# Altium schematic symbol library LATTICEPLDS_Library.SchLib: 291 symbols (part 18 of 32) (continued)
## LFE5G-85F-BG756 (continued)
part G pins: B1 PL17A (io), C1 PL20C (io), C2 PL17B (io), C3 PL11D (io), C4 PL11C (io), C5 PL11A/ ULC_GPLL0T_IN (io), D1 PL20D (io), D2 PL17D (io), D3 PL17C (io), D4 PL14A (io), D5 PL11B/ ULC_GPLL0C_IN (io), E1 PL23B (io), E3 PL20B (io), E4 PL14B (io), F1 PL23C (io), F2 PL23A (io), F3 PL20A (io), F4 PL14C (io), F5 PL14D (io), H1 PL23D (io), H2 PL26A (io), H3 PL26B (io), H5 PL35B (io), H6 PL35A (io), J1 PL29B (io), J3 PL26C (io), J4 PL32C (io), J6 PL35D (io), J7 PL35C/VREF1_7 (io), K1 PL29C (io), K2 PL29A (io), K3 PL26D (io), K4 PL32D (io), K5 PL38C (io), K6 PL38A (io), K7 PL38B (io), L1 PL29D (io), L2 PL32A (io), L3 PL32B (io), L4 PL38D (io), L6 PL41D (io), L7 PL41C/GR_PCLK7_0 (io), M10 VCCIO7 (power), N3 PL41A/GR_PCLK7_1 (io), N4 PL41B (io), N6 PL44A/PCLKT7_1 (io), N7 PL44B/PCLKC7_1 (io), P6 PL44C/PCLKT7_0 (io), P7 PL44D/PCLKC7_0 (io), P10 VCCIO7 (power), R10 VCCIO7 (power), T10 VCCIO7 (power)
part H pins: AB10 VCCIO8 (power), AC10 VCCIO8 (power), AG1 PB4A/ D7/IO7 (io), AG3 PB13A/ SN/CSN (io), AG4 INITN (io), AG5 TDO (io), AH1 PB4B/ D6/IO6 (io), AH3 PB13B/ CS1N (io), AH4 PROGRAMN (io), AJ1 PB6A/ D5/MISO2/IO5 (io), AJ2 PB11A/ D1/MISO/IO1 (io), AJ3 PB15A/ HOLDN/DI/BUSY/CSSPIN/CEN (io), AJ4 DONE (io), AJ5 TDI (io), AK1 PB6B/ D4/MOSI2/IO4 (io), AK2 PB11B/ D0/MOSI/IO0 (io), AK3 PB15B/ DOUT/CSON (io), AK4 CFG_2 (io), AK5 TCK (io), AL1 PB9A/ D3/IO3 (io), AL3 PB18A/ WRITEN (io), AL4 CFG_1 (io), AM2 PB9B/ D2/IO2 (io), AM3 CCLK (io), AM4 CFG_0 (io), AM5 TMS (io)
part I pins: AC13 VCCHTX0_D0CH0 (power), AC14 VCCHRX0_D0CH0 (power), AC15 VCCHRX1_D0CH1 (power), AC16 VCCHTX1_D0CH1 (power), AC17 VCCHTX0_D1CH0 (power), AC18 VCCHRX0_D1CH0 (power), AC19 VCCHRX1_D1CH1 (power), AC20 VCCHTX1_D1CH1 (power), AK9 HDTXP0_D0CH0 (out), AK10 HDTXN0_D0CH0 (out), AK12 HDTXP0_D0CH1 (out), AK13 HDTXN0_D0CH1 (out), AK18 HDTXP0_D1CH0 (out), AK19 HDTXN0_D1CH0 (out), AK21 HDTXP0_D1CH1 (out), AK22 HDTXN0_D1CH1 (out), AM8 HDRXP0_D0CH0 (in), AM9 HDRXN0_D0CH0 (in), AM11 HDRXP0_D0CH1 (in), AM12 HDRXN0_D0CH1 (in), AM14 REFCLKP_D0 (in), AM15 REFCLKN_D0 (in), AM17 HDRXP0_D1CH0 (in), AM18 HDRXN0_D1CH0 (in), AM20 HDRXP0_D1CH1 (in), AM21 HDRXN0_D1CH1 (in), AM23 REFCLKP_D1 (in), AM24 REFCLKN_D1 (in)
part J pins: AA11 GND (power), AA22 GND (power), AB11 GND (power), AB12 GND (power), AB13 GND (power), AB14 GND (power), AB15 GND (power), AB16 GND (power), AB17 GND (power), AB18 GND (power), AB19 GND (power), AB20 GND (power), AB21 GND (power), AB22 GND (power), AC12 GND (power), AC21 GND (power), AD2 GND (power), AD5 GND (power), AD28 GND (power), AD31 GND (power), AF11 GNDA (power), AF12 GNDA (power), AF14 GNDA (power), AF15 GNDA (power), AF16 GNDA (power), AF17 GNDA (power), AF19 GNDA (power), AF20 GNDA (power), AF23 GNDA (power), AG11 GNDA (power), AG14 GNDA (power), AG15 GNDA (power), AG16 GNDA (power), AG17 GNDA (power), AG20 GNDA (power), AG23 GNDA (power), AH2 GND (power), AH5 GND (power), AH7 GNDA (power), AH8 GNDA (power), AH11 GNDA (power), AH14 GNDA (power), AH15 GNDA (power), AH16 GNDA (power), AH17 GNDA (power), AH20 GNDA (power), AH23 GNDA (power), AH24 GNDA (power), AH25 GNDA (power), AH26 GNDA (power), AH29 GND (power), AH31 GND (power), AJ7 GNDA (power), AJ8 GNDA (power), AJ11 GNDA (power), AJ14 GNDA (power), AJ17 GNDA (power), AJ20 GNDA (power), AJ23 GNDA (power), AJ26 GNDA (power), AK7 GNDA (power), AK8 GNDA (power), AK11 GNDA (power), AK14 GNDA (power), AK17 GNDA (power), AK20 GNDA (power), AK23 GNDA (power), AK26 GNDA (power), AL2 GND (power), AL5 GND (power), AL7 GNDA (power), AL8 GNDA (power), AL9 GNDA (power), AL11 GNDA (power), AL12 GNDA (power), AL14 GNDA (power), AL15 GNDA (power), AL17 GNDA (power), AL18 GNDA (power), AL20 GNDA (power), AL21 GNDA (power), AL23 GNDA (power), AL24 GNDA (power), AL26 GNDA (power), AL29 GND (power), AL31 GND (power), AM7 GNDA (power), AM26 GNDA (power), B2 GND (power), B5 GND (power), B9 GND (power), B13 GND (power), B15 GND (power), B18 GND (power), B20 GND (power), B24 GND (power), B28 GND (power), B31 GND (power), E2 GND (power), E5 GND (power), E9 GND (power), E13 GND (power), E15 GND (power), E18 GND (power), E20 GND (power), E24 GND (power), E28 GND (power), E31 GND (power), J2 GND (power), J5 GND (power), J28 GND (power), J31 GND (power), K10 GND (power), K11 GND (power), K22 GND (power), K23 GND (power), L10 GND (power), L11 GND (power), L12 GND (power), L13 GND (power), L14 GND (power), L15 GND (power), L16 GND (power), L17 GND (power), L18 GND (power), L19 GND (power), L20 GND (power), L21 GND (power), L22 GND (power), L23 GND (power), M11 GND (power), M22 GND (power), N2 GND (power), N5 GND (power), N11 GND (power), N13 GND (power), N14 GND (power), N15 GND (power), N16 GND (power), N17 GND (power), N18 GND (power), N19 GND (power), N20 GND (power), N22 GND (power), N28 GND (power), N31 GND (power), P11 GND (power), P13 GND (power), P14 GND (power), P15 GND (power), P16 GND (power), P17 GND (power), P18 GND (power), P19 GND (power), P20 GND (power), P22 GND (power), R2 GND (power), R5 GND (power), R11 GND (power), R13 GND (power), R14 GND (power), R15 GND (power), R16 GND (power), R17 GND (power), R18 GND (power), R19 GND (power), R20 GND (power), R22 GND (power), R28 GND (power), R31 GND (power), T11 GND (power), T13 GND (power), T14 GND (power), T15 GND (power), T16 GND (power), T17 GND (power), T18 GND (power), T19 GND (power), T20 GND (power), T22 GND (power), U11 GND (power), U13 GND (power), U14 GND (power), U15 GND (power), U16 GND (power), U17 GND (power), U18 GND (power), U19 GND (power), U20 GND (power), U22 GND (power), V2 GND (power), V5 GND (power), V11 GND (power), V13 GND (power), V14 GND (power), V15 GND (power), V16 GND (power), V17 GND (power), V18 GND (power), V19 GND (power), V20 GND (power), V22 GND (power), V28 GND (power), V31 GND (power), W11 GND (power), W13 GND (power), W14 GND (power), W15 GND (power), W16 GND (power), W17 GND (power), W18 GND (power), W19 GND (power), W20 GND (power), W22 GND (power), Y2 GND (power), Y11 GND (power), Y13 GND (power), Y14 GND (power), Y15 GND (power), Y16 GND (power), Y17 GND (power), Y18 GND (power), Y19 GND (power), Y20 GND (power), Y22 GND (power), Y31 GND (power)
part K pins: AA12 VCC (power), AA13 VCC (power), AA14 VCC (power), AA15 VCC (power), AA16 VCC (power), AA17 VCC (power), AA18 VCC (power), AA19 VCC (power), AA20 VCC (power), AA21 VCC (power), AC11 VCCAUX (power), AC22 VCCAUX (power), AF22 VCCA1 (power), AG9 VCCA0 (power), AG12 VCCA0 (power), AG19 VCCA1 (power), AG22 VCCA1 (power), AH9 VCCA0 (power), AH12 VCCA0 (power), AH19 VCCA1 (power), AH22 VCCA1 (power), AJ9 VCCA0 (power), AJ10 VCCA0 (power), AJ12 VCCA0 (power), AJ13 VCCA0 (power), AJ15 VCCAUXA0 (power), AJ16 VCCAUXA0 (power), AJ18 VCCA1 (power), AJ19 VCCA1 (power), AJ21 VCCA1 (power), AJ22 VCCA1 (power), AJ24 VCCAUXA1 (power), AJ25 VCCAUXA1 (power), K13 VCCAUX (power), K20 VCCAUX (power), M12 VCC (power), M13 VCC (power), M14 VCC (power), M15 VCC (power), M16 VCC (power), M17 VCC (power), M18 VCC (power), M19 VCC (power), M20 VCC (power), M21 VCC (power), N10 VCCAUX (power), N12 VCC (power), N21 VCC (power), N23 VCCAUX (power), P12 VCC (power), P21 VCC (power), R12 VCC (power), R21 VCC (power), T12 VCC (power), T21 VCC (power), U12 VCC (power), U21 VCC (power), V12 VCC (power), V21 VCC (power), W12 VCC (power), W21 VCC (power), Y10 VCCAUX (power), Y12 VCC (power), Y21 VCC (power), Y23 VCCAUX (power)
part L pins: AC4 NC (power), AC29 NC (power), AE7 NC (power), AE26 NC (power), AG2 NC (power), AG24 NC (power), AG31 NC (power), AK15 RESERVED (io), AK16 RESERVED (io), AK24 RESERVED (io), AK25 RESERVED (io), E7 NC (power), E26 NC (power), G9 NC (power), G10 NC (power), G11 NC (power), G14 NC (power), G15 NC (power), G16 NC (power), G17 NC (power), G18 NC (power), G19 NC (power), G22 NC (power), G23 NC (power), G24 NC (power), H4 NC (power), H29 NC (power), L5 NC (power), L28 NC (power), V3 NC (power), V30 NC (power), W6 NC (power), W27 NC (power)

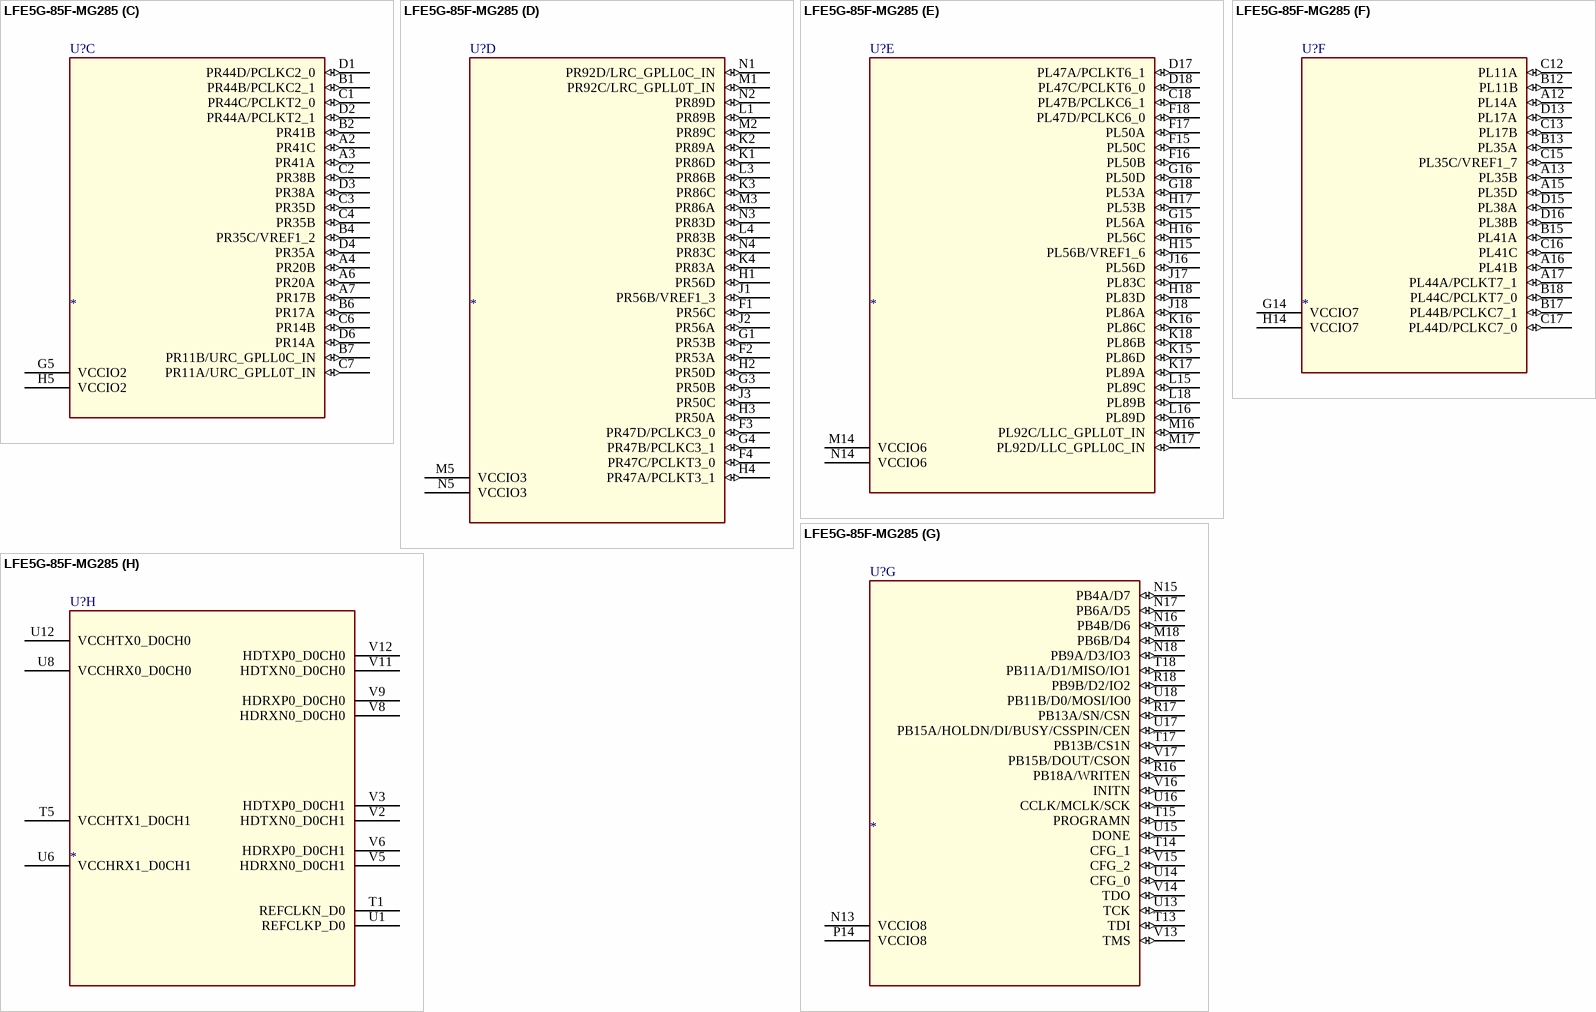
[diagram p170: symbol LFE5G-85F-MG285]

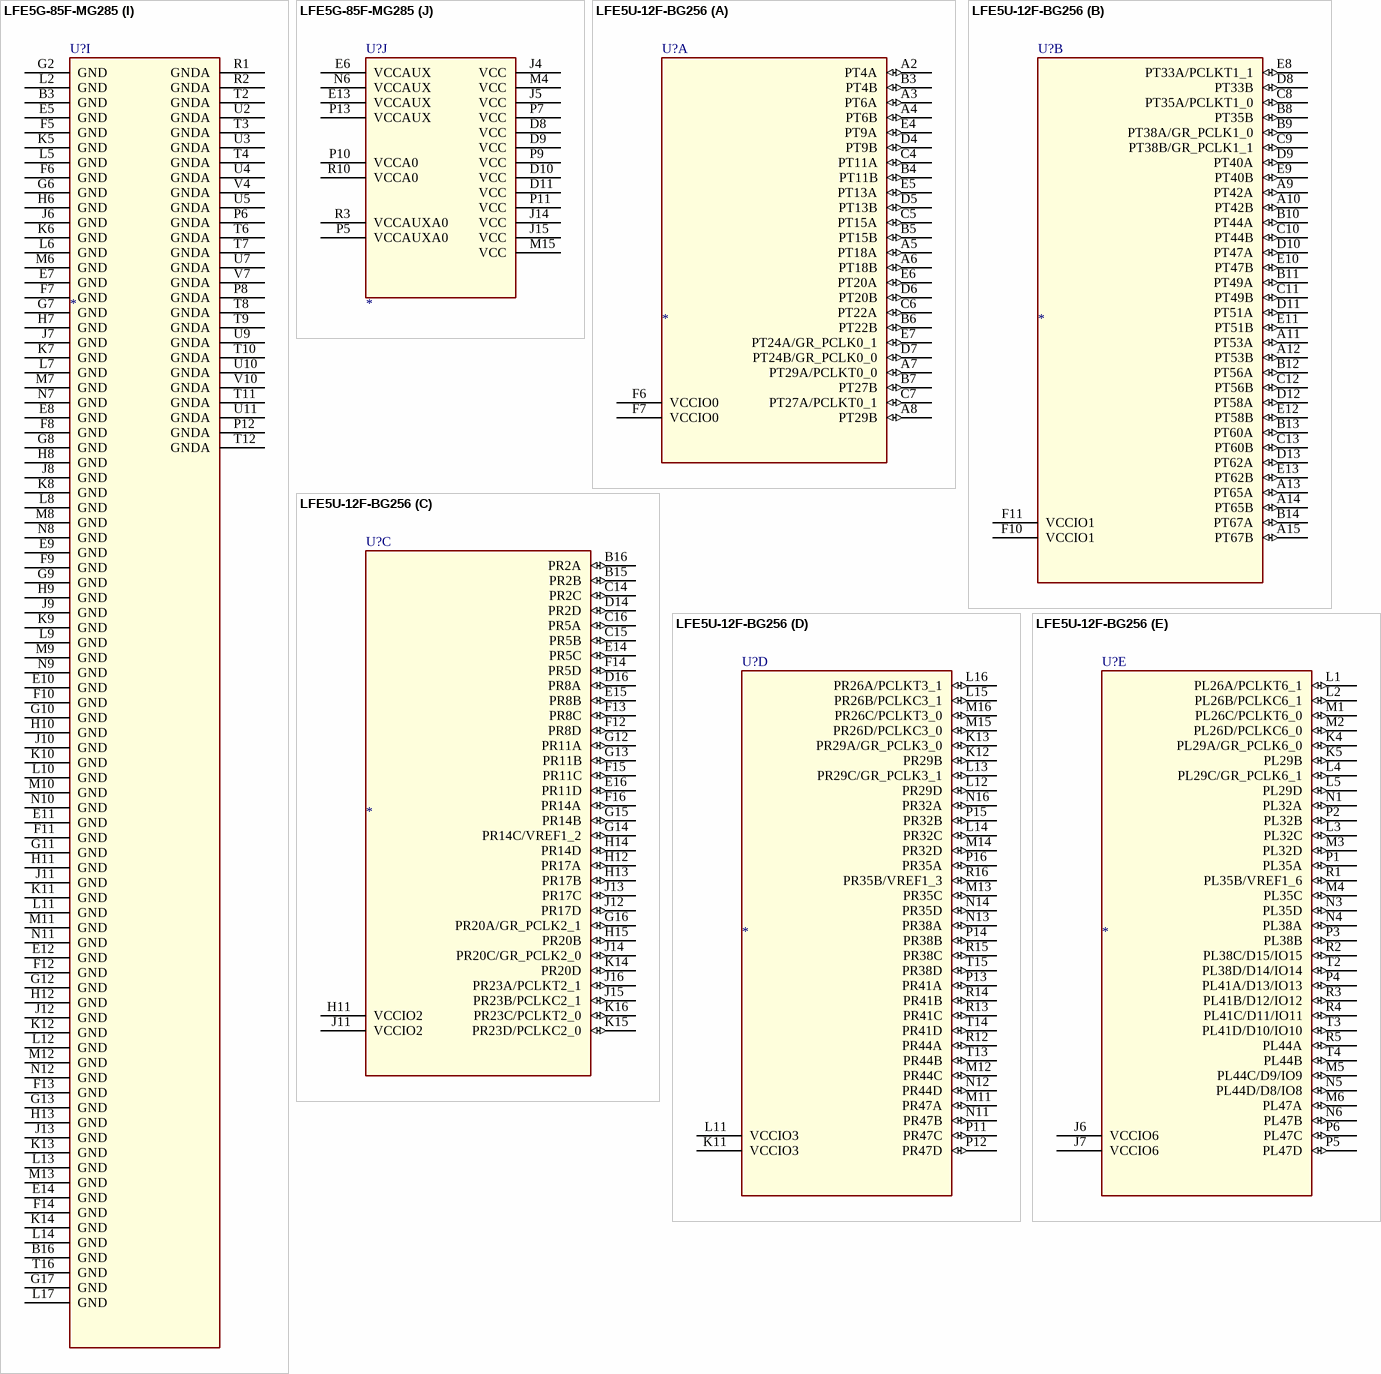
[diagram p171: symbols LFE5G-85F-MG285 to LFE5U-12F-BG256]

## LFE5G-85F-MG285
designator U?
SPLIT_INST: TRUE; SWAP_INFO: (S1+S2+S3+S4+S5+S6+S7+S8+S9+S10)
part A pins: A10 PT63B/PCLKC0_1 (io), A11 PT63A/PCLKT0_1 (io), B10 PT65A/PCLKT0_0 (io), B11 PT4A/ULC_GPLL1T_IN (io), C10 PT65B/PCLKC0_0 (io), C11 PT4B/ULC_GPLL1C_IN (io), D12 VCCIO0 (power)
part B pins: A8 PT71B/PCLKC1_0 (io), A9 PT71A/PCLKT1_0 (io), B8 PT121A/URC_GPLL1T_IN (io), B9 PT69A/PCLKT1_1 (io), C8 PT121B/URC_GPLL1C_IN (io), C9 PT69B/PCLKC1_1 (io), D7 VCCIO1 (power)
part C pins: A2 PR41C (io), A3 PR41A (io), A4 PR20B (io), A6 PR20A (io), A7 PR17B (io), B1 PR44B/PCLKC2_1 (io), B2 PR41B (io), B4 PR35C/VREF1_2 (io), B6 PR17A (io), B7 PR11B/URC_GPLL0C_IN (io), C1 PR44C/PCLKT2_0 (io), C2 PR38B (io), C3 PR35D (io), C4 PR35B (io), C6 PR14B (io), C7 PR11A/URC_GPLL0T_IN (io), D1 PR44D/PCLKC2_0 (io), D2 PR44A/PCLKT2_1 (io), D3 PR38A (io), D4 PR35A (io), D6 PR14A (io), G5 VCCIO2 (power), H5 VCCIO2 (power)
part D pins: F1 PR56C (io), F2 PR53A (io), F3 PR47D/PCLKC3_0 (io), F4 PR47C/PCLKT3_0 (io), G1 PR53B (io), G3 PR50B (io), G4 PR47B/PCLKC3_1 (io), H1 PR56D (io), H2 PR50D (io), H3 PR50A (io), H4 PR47A/PCLKT3_1 (io), J1 PR56B/VREF1_3 (io), J2 PR56A (io), J3 PR50C (io), K1 PR86D (io), K2 PR89A (io), K3 PR86C (io), K4 PR83A (io), L1 PR89B (io), L3 PR86B (io), L4 PR83B (io), M1 PR92C/LRC_GPLL0T_IN (io), M2 PR89C (io), M3 PR86A (io), M5 VCCIO3 (power), N1 PR92D/LRC_GPLL0C_IN (io), N2 PR89D (io), N3 PR83D (io), N4 PR83C (io), N5 VCCIO3 (power)
part E pins: C18 PL47B/PCLKC6_1 (io), D17 PL47A/PCLKT6_1 (io), D18 PL47C/PCLKT6_0 (io), F15 PL50C (io), F16 PL50B (io), F17 PL50A (io), F18 PL47D/PCLKC6_0 (io), G15 PL56A (io), G16 PL50D (io), G18 PL53A (io), H15 PL56B/VREF1_6 (io), H16 PL56C (io), H17 PL53B (io), H18 PL83D (io), J16 PL56D (io), J17 PL83C (io), J18 PL86A (io), K15 PL86D (io), K16 PL86C (io), K17 PL89A (io), K18 PL86B (io), L15 PL89C (io), L16 PL89D (io), L18 PL89B (io), M14 VCCIO6 (power), M16 PL92C/LLC_GPLL0T_IN (io), M17 PL92D/LLC_GPLL0C_IN (io), N14 VCCIO6 (power)
part F pins: A12 PL14A (io), A13 PL35B (io), A15 PL35D (io), A16 PL41B (io), A17 PL44A/PCLKT7_1 (io), B12 PL11B (io), B13 PL35A (io), B15 PL41A (io), B17 PL44B/PCLKC7_1 (io), B18 PL44C/PCLKT7_0 (io), C12 PL11A (io), C13 PL17B (io), C15 PL35C/VREF1_7 (io), C16 PL41C (io), C17 PL44D/PCLKC7_0 (io), D13 PL17A (io), D15 PL38A (io), D16 PL38B (io), G14 VCCIO7 (power), H14 VCCIO7 (power)
part G pins: M18 PB6B/D4 (io), N13 VCCIO8 (power), N15 PB4A/D7 (io), N16 PB4B/D6 (io), N17 PB6A/D5 (io), N18 PB9A/D3/IO3 (io), P14 VCCIO8 (power), R16 PB18A/WRITEN (io), R17 PB13A/SN/CSN (io), R18 PB9B/D2/IO2 (io), T13 TDI (io), T14 CFG_1 (io), T15 PROGRAMN (io), T17 PB13B/CS1N (io), T18 PB11A/D1/MISO/IO1 (io), U13 TCK (io), U14 CFG_0 (io), U15 DONE (io), U16 CCLK/MCLK/SCK (io), U17 PB15A/HOLDN/DI/BUSY/CSSPIN/CEN (io), U18 PB11B/D0/MOSI/IO0 (io), V13 TMS (io), V14 TDO (io), V15 CFG_2 (io), V16 INITN (io), V17 PB15B/DOUT/CSON (io)
part H pins: T1 REFCLKN_D0 (power), T5 VCCHTX1_D0CH1 (power), U1 REFCLKP_D0 (power), U6 VCCHRX1_D0CH1 (power), U8 VCCHRX0_D0CH0 (power), U12 VCCHTX0_D0CH0 (power), V2 HDTXN0_D0CH1 (power), V3 HDTXP0_D0CH1 (power), V5 HDRXN0_D0CH1 (power), V6 HDRXP0_D0CH1 (power), V8 HDRXN0_D0CH0 (power), V9 HDRXP0_D0CH0 (power), V11 HDTXN0_D0CH0 (power), V12 HDTXP0_D0CH0 (power)
part I pins: B3 GND (power), B16 GND (power), E5 GND (power), E7 GND (power), E8 GND (power), E9 GND (power), E10 GND (power), E11 GND (power), E12 GND (power), E14 GND (power), F5 GND (power), F6 GND (power), F7 GND (power), F8 GND (power), F9 GND (power), F10 GND (power), F11 GND (power), F12 GND (power), F13 GND (power), F14 GND (power), G2 GND (power), G6 GND (power), G7 GND (power), G8 GND (power), G9 GND (power), G10 GND (power), G11 GND (power), G12 GND (power), G13 GND (power), G17 GND (power), H6 GND (power), H7 GND (power), H8 GND (power), H9 GND (power), H10 GND (power), H11 GND (power), H12 GND (power), H13 GND (power), J6 GND (power), J7 GND (power), J8 GND (power), J9 GND (power), J10 GND (power), J11 GND (power), J12 GND (power), J13 GND (power), K5 GND (power), K6 GND (power), K7 GND (power), K8 GND (power), K9 GND (power), K10 GND (power), K11 GND (power), K12 GND (power), K13 GND (power), K14 GND (power), L2 GND (power), L5 GND (power), L6 GND (power), L7 GND (power), L8 GND (power), L9 GND (power), L10 GND (power), L11 GND (power), L12 GND (power), L13 GND (power), L14 GND (power), L17 GND (power), M6 GND (power), M7 GND (power), M8 GND (power), M9 GND (power), M10 GND (power), M11 GND (power), M12 GND (power), M13 GND (power), N7 GND (power), N8 GND (power), N9 GND (power), N10 GND (power), N11 GND (power), N12 GND (power), P6 GNDA (power), P8 GNDA (power), P12 GNDA (power), R1 GNDA (power), R2 GNDA (power), T2 GNDA (power), T3 GNDA (power), T4 GNDA (power), T6 GNDA (power), T7 GNDA (power), T8 GNDA (power), T9 GNDA (power), T10 GNDA (power), T11 GNDA (power), T12 GNDA (power), T16 GND (power), U2 GNDA (power), U3 GNDA (power), U4 GNDA (power), U5 GNDA (power), U7 GNDA (power), U9 GNDA (power), U10 GNDA (power), U11 GNDA (power), V4 GNDA (power), V7 GNDA (power), V10 GNDA (power)
part J pins: D8 VCC (power), D9 VCC (power), D10 VCC (power), D11 VCC (power), E6 VCCAUX (power), E13 VCCAUX (power), J4 VCC (power), J5 VCC (power), J14 VCC (power), J15 VCC (power), M4 VCC (power), M15 VCC (power), N6 VCCAUX (power), P5 VCCAUXA0 (power), P7 VCC (power), P9 VCC (power), P10 VCCA0 (power), P11 VCC (power), P13 VCCAUX (power), R3 VCCAUXA0 (power), R10 VCCA0 (power)

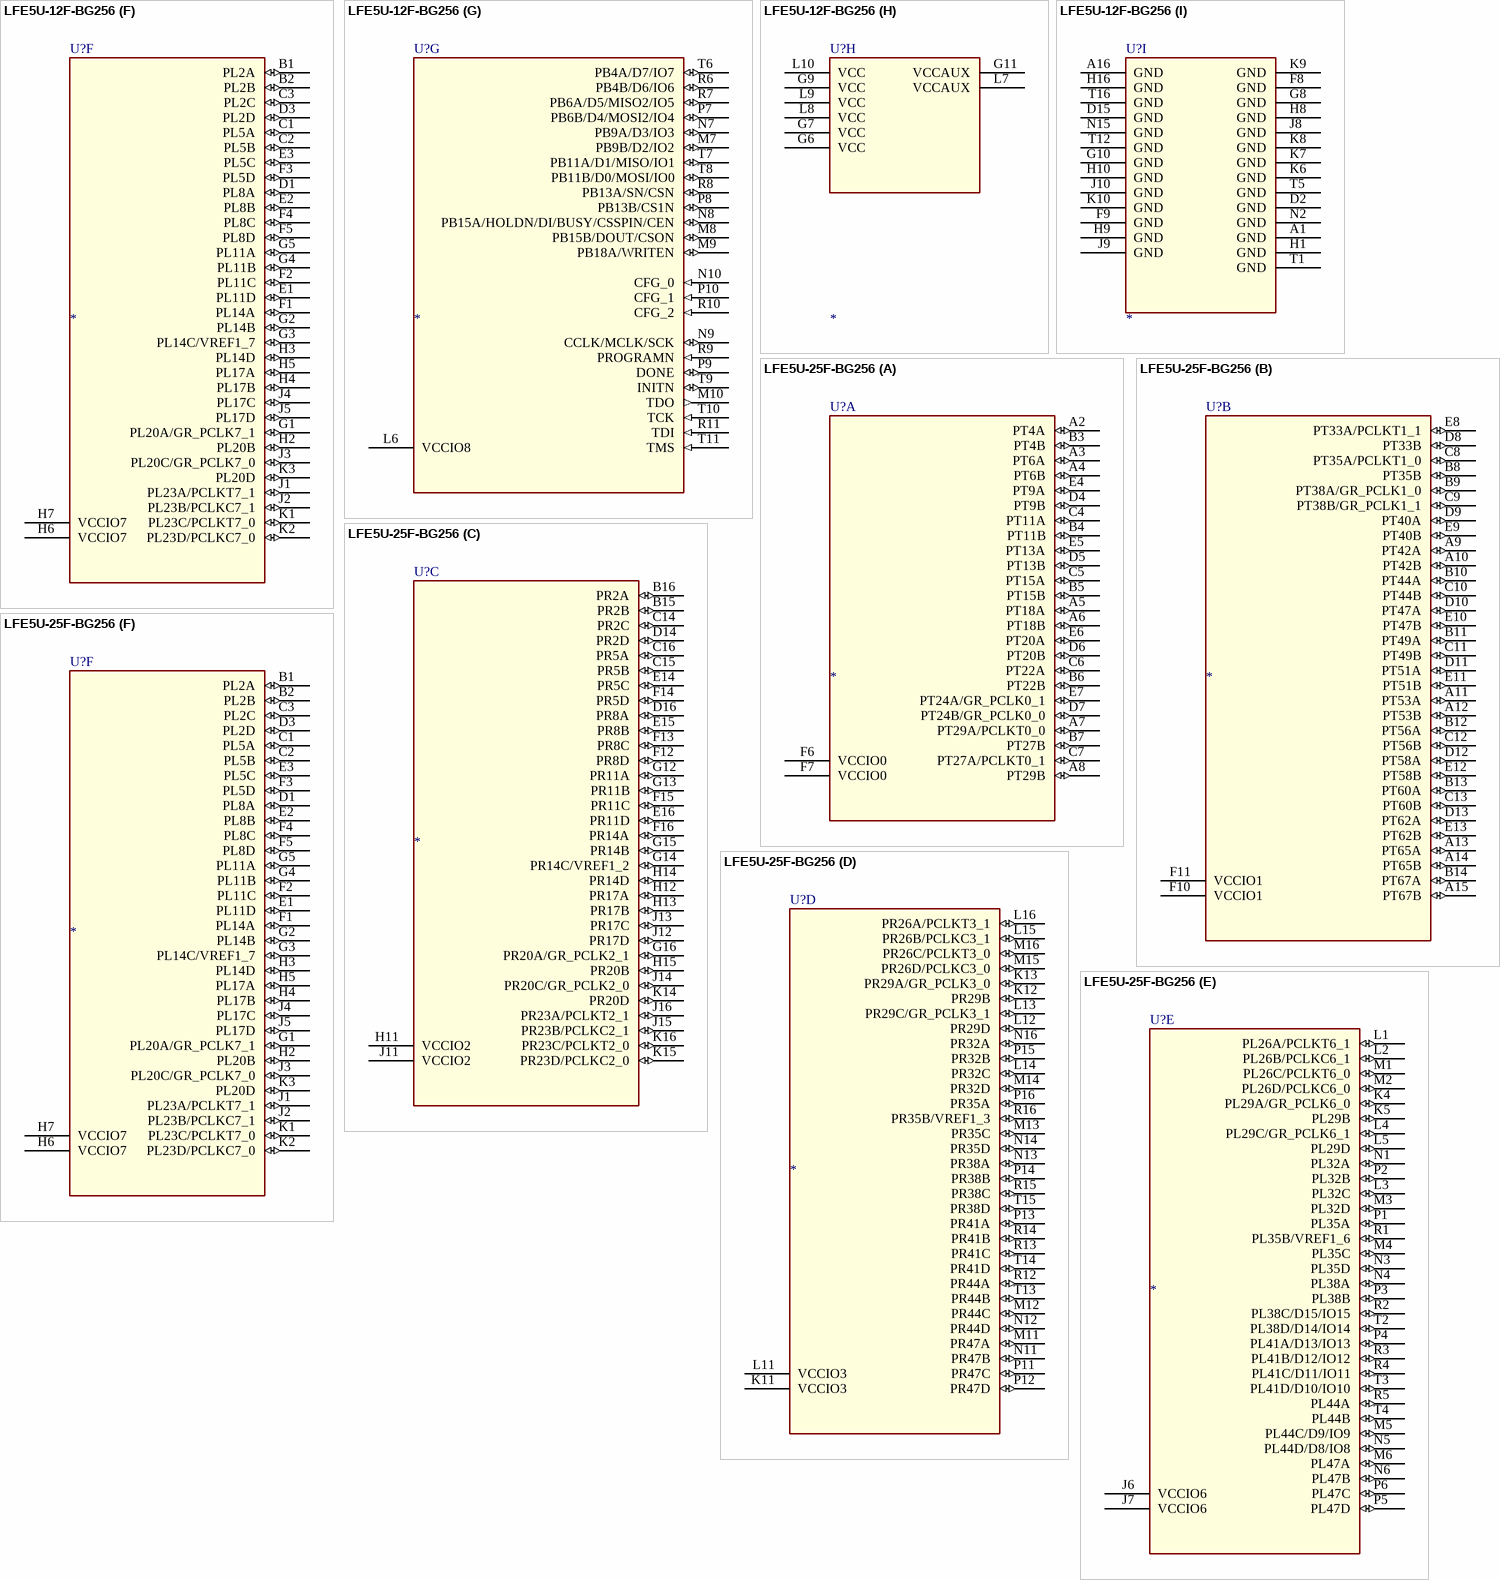
[diagram p172: symbols LFE5U-12F-BG256 to LFE5U-25F-BG256]

## LFE5U-12F-BG256
designator U?
SPLIT_INST: TRUE; SWAP_INFO: (S1+S2+S3+S4+S5+S6+S7+S8+S9)
part A pins: A2 PT4A (io), A3 PT6A (io), A4 PT6B (io), A5 PT18A (io), A6 PT18B (io), A7 PT29A/PCLKT0_0 (io), A8 PT29B (io), B3 PT4B (io), B4 PT11B (io), B5 PT15B (io), B6 PT22B (io), B7 PT27B (io), C4 PT11A (io), C5 PT15A (io), C6 PT22A (io), C7 PT27A/PCLKT0_1 (io), D4 PT9B (io), D5 PT13B (io), D6 PT20B (io), D7 PT24B/GR_PCLK0_0 (io), E4 PT9A (io), E5 PT13A (io), E6 PT20A (io), E7 PT24A/GR_PCLK0_1 (io), F6 VCCIO0 (power), F7 VCCIO0 (power)
part B pins: A9 PT42A (io), A10 PT42B (io), A11 PT53A (io), A12 PT53B (io), A13 PT65A (io), A14 PT65B (io), A15 PT67B (io), B8 PT35B (io), B9 PT38A/GR_PCLK1_0 (io), B10 PT44A (io), B11 PT49A (io), B12 PT56A (io), B13 PT60A (io), B14 PT67A (io), C8 PT35A/PCLKT1_0 (io), C9 PT38B/GR_PCLK1_1 (io), C10 PT44B (io), C11 PT49B (io), C12 PT56B (io), C13 PT60B (io), D8 PT33B (io), D9 PT40A (io), D10 PT47A (io), D11 PT51A (io), D12 PT58A (io), D13 PT62A (io), E8 PT33A/PCLKT1_1 (io), E9 PT40B (io), E10 PT47B (io), E11 PT51B (io), E12 PT58B (io), E13 PT62B (io), F10 VCCIO1 (power), F11 VCCIO1 (power)
part C pins: B15 PR2B (io), B16 PR2A (io), C14 PR2C (io), C15 PR5B (io), C16 PR5A (io), D14 PR2D (io), D16 PR8A (io), E14 PR5C (io), E15 PR8B (io), E16 PR11D (io), F12 PR8D (io), F13 PR8C (io), F14 PR5D (io), F15 PR11C (io), F16 PR14A (io), G12 PR11A (io), G13 PR11B (io), G14 PR14C/VREF1_2 (io), G15 PR14B (io), G16 PR20A/GR_PCLK2_1 (io), H11 VCCIO2 (power), H12 PR17A (io), H13 PR17B (io), H14 PR14D (io), H15 PR20B (io), J11 VCCIO2 (power), J12 PR17D (io), J13 PR17C (io), J14 PR20C/GR_PCLK2_0 (io), J15 PR23B/PCLKC2_1 (io), J16 PR23A/PCLKT2_1 (io), K14 PR20D (io), K15 PR23D/PCLKC2_0 (io), K16 PR23C/PCLKT2_0 (io)
part D pins: K11 VCCIO3 (power), K12 PR29B (io), K13 PR29A/GR_PCLK3_0 (io), L11 VCCIO3 (power), L12 PR29D (io), L13 PR29C/GR_PCLK3_1 (io), L14 PR32C (io), L15 PR26B/PCLKC3_1 (io), L16 PR26A/PCLKT3_1 (io), M11 PR47A (io), M12 PR44C (io), M13 PR35C (io), M14 PR32D (io), M15 PR26D/PCLKC3_0 (io), M16 PR26C/PCLKT3_0 (io), N11 PR47B (io), N12 PR44D (io), N13 PR38A (io), N14 PR35D (io), N16 PR32A (io), P11 PR47C (io), P12 PR47D (io), P13 PR41A (io), P14 PR38B (io), P15 PR32B (io), P16 PR35A (io), R12 PR44A (io), R13 PR41C (io), R14 PR41B (io), R15 PR38C (io), R16 PR35B/VREF1_3 (io), T13 PR44B (io), T14 PR41D (io), T15 PR38D (io)
part E pins: J6 VCCIO6 (power), J7 VCCIO6 (power), K4 PL29A/GR_PCLK6_0 (io), K5 PL29B (io), L1 PL26A/PCLKT6_1 (io), L2 PL26B/PCLKC6_1 (io), L3 PL32C (io), L4 PL29C/GR_PCLK6_1 (io), L5 PL29D (io), M1 PL26C/PCLKT6_0 (io), M2 PL26D/PCLKC6_0 (io), M3 PL32D (io), M4 PL35C (io), M5 PL44C/D9/IO9 (io), M6 PL47A (io), N1 PL32A (io), N3 PL35D (io), N4 PL38A (io), N5 PL44D/D8/IO8 (io), N6 PL47B (io), P1 PL35A (io), P2 PL32B (io), P3 PL38B (io), P4 PL41A/D13/IO13 (io), P5 PL47D (io), P6 PL47C (io), R1 PL35B/VREF1_6 (io), R2 PL38C/D15/IO15 (io), R3 PL41B/D12/IO12 (io), R4 PL41C/D11/IO11 (io), R5 PL44A (io), T2 PL38D/D14/IO14 (io), T3 PL41D/D10/IO10 (io), T4 PL44B (io)
part F pins: B1 PL2A (io), B2 PL2B (io), C1 PL5A (io), C2 PL5B (io), C3 PL2C (io), D1 PL8A (io), D3 PL2D (io), E1 PL11D (io), E2 PL8B (io), E3 PL5C (io), F1 PL14A (io), F2 PL11C (io), F3 PL5D (io), F4 PL8C (io), F5 PL8D (io), G1 PL20A/GR_PCLK7_1 (io), G2 PL14B (io), G3 PL14C/VREF1_7 (io), G4 PL11B (io), G5 PL11A (io), H2 PL20B (io), H3 PL14D (io), H4 PL17B (io), H5 PL17A (io), H6 VCCIO7 (power), H7 VCCIO7 (power), J1 PL23A/PCLKT7_1 (io), J2 PL23B/PCLKC7_1 (io), J3 PL20C/GR_PCLK7_0 (io), J4 PL17C (io), J5 PL17D (io), K1 PL23C/PCLKT7_0 (io), K2 PL23D/PCLKC7_0 (io), K3 PL20D (io)
part G pins: L6 VCCIO8 (power), M7 PB9B/D2/IO2 (io), M8 PB15B/DOUT/CSON (io), M9 PB18A/WRITEN (io), M10 TDO (out), N7 PB9A/D3/IO3 (io), N8 PB15A/HOLDN/DI/BUSY/CSSPIN/CEN (io), N9 CCLK/MCLK/SCK (io), N10 CFG_0 (in), P7 PB6B/D4/MOSI2/IO4 (io), P8 PB13B/CS1N (io), P9 DONE (io), P10 CFG_1 (in), R6 PB4B/D6/IO6 (io), R7 PB6A/D5/MISO2/IO5 (io), R8 PB13A/SN/CSN (io), R9 PROGRAMN (in), R10 CFG_2 (in), R11 TDI (in), T6 PB4A/D7/IO7 (io), T7 PB11A/D1/MISO/IO1 (io), T8 PB11B/D0/MOSI/IO0 (io), T9 INITN (io), T10 TCK (in), T11 TMS (in)
part H pins: G6 VCC (power), G7 VCC (power), G9 VCC (power), G11 VCCAUX (power), L7 VCCAUX (power), L8 VCC (power), L9 VCC (power), L10 VCC (power)
part I pins: A1 GND (power), A16 GND (power), D2 GND (power), D15 GND (power), F8 GND (power), F9 GND (power), G8 GND (power), G10 GND (power), H1 GND (power), H8 GND (power), H9 GND (power), H10 GND (power), H16 GND (power), J8 GND (power), J9 GND (power), J10 GND (power), K6 GND (power), K7 GND (power), K8 GND (power), K9 GND (power), K10 GND (power), N2 GND (power), N15 GND (power), T1 GND (power), T5 GND (power), T12 GND (power), T16 GND (power)

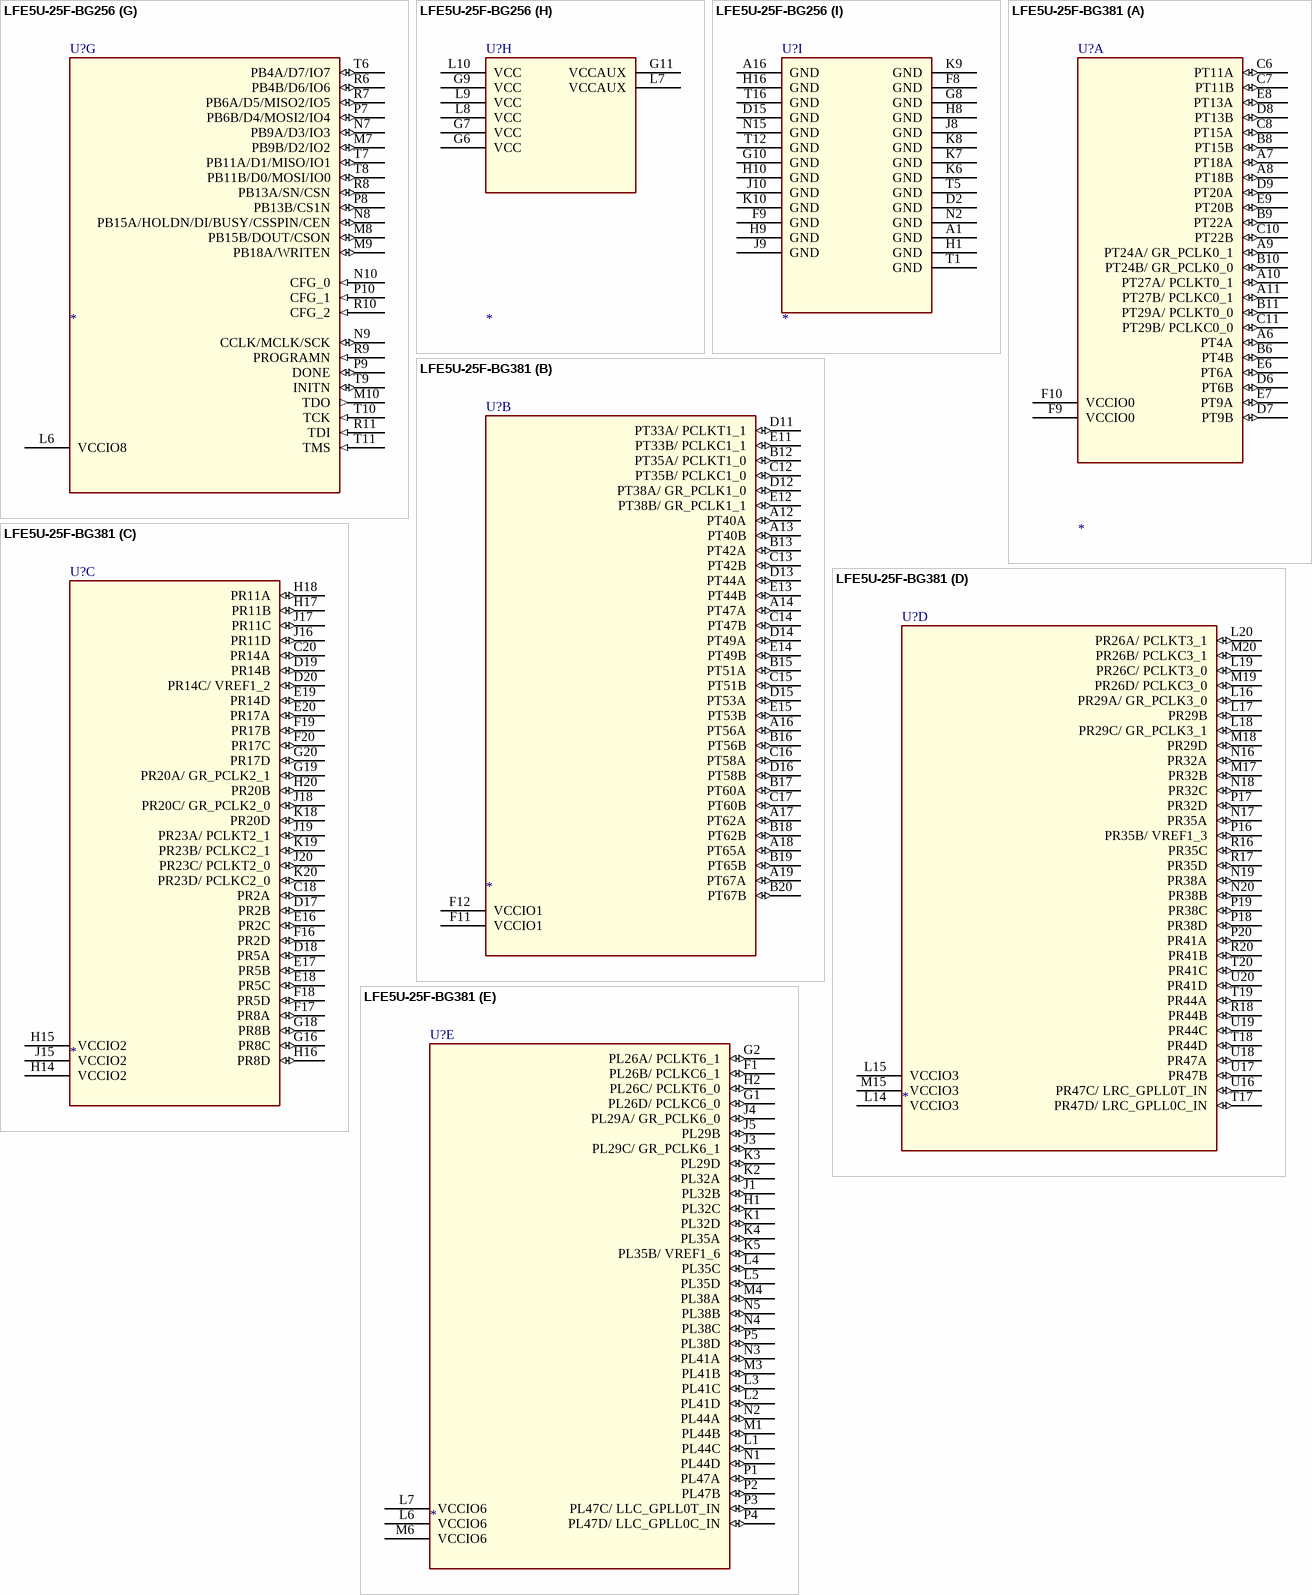
[diagram p173: symbols LFE5U-25F-BG256 to LFE5U-25F-BG381]

## LFE5U-25F-BG256
designator U?
SWAP_INFO: (S1+S2+S3+S4+S5+S6+S7+S8+S9); SPLIT_INST: TRUE
footprint caBGA256 (256-Ball Chip Array Ball Grid Array)
part A pins: A2 PT4A (io), A3 PT6A (io), A4 PT6B (io), A5 PT18A (io), A6 PT18B (io), A7 PT29A/PCLKT0_0 (io), A8 PT29B (io), B3 PT4B (io), B4 PT11B (io), B5 PT15B (io), B6 PT22B (io), B7 PT27B (io), C4 PT11A (io), C5 PT15A (io), C6 PT22A (io), C7 PT27A/PCLKT0_1 (io), D4 PT9B (io), D5 PT13B (io), D6 PT20B (io), D7 PT24B/GR_PCLK0_0 (io), E4 PT9A (io), E5 PT13A (io), E6 PT20A (io), E7 PT24A/GR_PCLK0_1 (io), F6 VCCIO0 (power), F7 VCCIO0 (power)
part B pins: A9 PT42A (io), A10 PT42B (io), A11 PT53A (io), A12 PT53B (io), A13 PT65A (io), A14 PT65B (io), A15 PT67B (io), B8 PT35B (io), B9 PT38A/GR_PCLK1_0 (io), B10 PT44A (io), B11 PT49A (io), B12 PT56A (io), B13 PT60A (io), B14 PT67A (io), C8 PT35A/PCLKT1_0 (io), C9 PT38B/GR_PCLK1_1 (io), C10 PT44B (io), C11 PT49B (io), C12 PT56B (io), C13 PT60B (io), D8 PT33B (io), D9 PT40A (io), D10 PT47A (io), D11 PT51A (io), D12 PT58A (io), D13 PT62A (io), E8 PT33A/PCLKT1_1 (io), E9 PT40B (io), E10 PT47B (io), E11 PT51B (io), E12 PT58B (io), E13 PT62B (io), F10 VCCIO1 (power), F11 VCCIO1 (power)
part C pins: B15 PR2B (io), B16 PR2A (io), C14 PR2C (io), C15 PR5B (io), C16 PR5A (io), D14 PR2D (io), D16 PR8A (io), E14 PR5C (io), E15 PR8B (io), E16 PR11D (io), F12 PR8D (io), F13 PR8C (io), F14 PR5D (io), F15 PR11C (io), F16 PR14A (io), G12 PR11A (io), G13 PR11B (io), G14 PR14C/VREF1_2 (io), G15 PR14B (io), G16 PR20A/GR_PCLK2_1 (io), H11 VCCIO2 (power), H12 PR17A (io), H13 PR17B (io), H14 PR14D (io), H15 PR20B (io), J11 VCCIO2 (power), J12 PR17D (io), J13 PR17C (io), J14 PR20C/GR_PCLK2_0 (io), J15 PR23B/PCLKC2_1 (io), J16 PR23A/PCLKT2_1 (io), K14 PR20D (io), K15 PR23D/PCLKC2_0 (io), K16 PR23C/PCLKT2_0 (io)
part D pins: K11 VCCIO3 (power), K12 PR29B (io), K13 PR29A/GR_PCLK3_0 (io), L11 VCCIO3 (power), L12 PR29D (io), L13 PR29C/GR_PCLK3_1 (io), L14 PR32C (io), L15 PR26B/PCLKC3_1 (io), L16 PR26A/PCLKT3_1 (io), M11 PR47A (io), M12 PR44C (io), M13 PR35C (io), M14 PR32D (io), M15 PR26D/PCLKC3_0 (io), M16 PR26C/PCLKT3_0 (io), N11 PR47B (io), N12 PR44D (io), N13 PR38A (io), N14 PR35D (io), N16 PR32A (io), P11 PR47C (io), P12 PR47D (io), P13 PR41A (io), P14 PR38B (io), P15 PR32B (io), P16 PR35A (io), R12 PR44A (io), R13 PR41C (io), R14 PR41B (io), R15 PR38C (io), R16 PR35B/VREF1_3 (io), T13 PR44B (io), T14 PR41D (io), T15 PR38D (io)
part E pins: J6 VCCIO6 (power), J7 VCCIO6 (power), K4 PL29A/GR_PCLK6_0 (io), K5 PL29B (io), L1 PL26A/PCLKT6_1 (io), L2 PL26B/PCLKC6_1 (io), L3 PL32C (io), L4 PL29C/GR_PCLK6_1 (io), L5 PL29D (io), M1 PL26C/PCLKT6_0 (io), M2 PL26D/PCLKC6_0 (io), M3 PL32D (io), M4 PL35C (io), M5 PL44C/D9/IO9 (io), M6 PL47A (io), N1 PL32A (io), N3 PL35D (io), N4 PL38A (io), N5 PL44D/D8/IO8 (io), N6 PL47B (io), P1 PL35A (io), P2 PL32B (io), P3 PL38B (io), P4 PL41A/D13/IO13 (io), P5 PL47D (io), P6 PL47C (io), R1 PL35B/VREF1_6 (io), R2 PL38C/D15/IO15 (io), R3 PL41B/D12/IO12 (io), R4 PL41C/D11/IO11 (io), R5 PL44A (io), T2 PL38D/D14/IO14 (io), T3 PL41D/D10/IO10 (io), T4 PL44B (io)
part F pins: B1 PL2A (io), B2 PL2B (io), C1 PL5A (io), C2 PL5B (io), C3 PL2C (io), D1 PL8A (io), D3 PL2D (io), E1 PL11D (io), E2 PL8B (io), E3 PL5C (io), F1 PL14A (io), F2 PL11C (io), F3 PL5D (io), F4 PL8C (io), F5 PL8D (io), G1 PL20A/GR_PCLK7_1 (io), G2 PL14B (io), G3 PL14C/VREF1_7 (io), G4 PL11B (io), G5 PL11A (io), H2 PL20B (io), H3 PL14D (io), H4 PL17B (io), H5 PL17A (io), H6 VCCIO7 (power), H7 VCCIO7 (power), J1 PL23A/PCLKT7_1 (io), J2 PL23B/PCLKC7_1 (io), J3 PL20C/GR_PCLK7_0 (io), J4 PL17C (io), J5 PL17D (io), K1 PL23C/PCLKT7_0 (io), K2 PL23D/PCLKC7_0 (io), K3 PL20D (io)
part G pins: L6 VCCIO8 (power), M7 PB9B/D2/IO2 (io), M8 PB15B/DOUT/CSON (io), M9 PB18A/WRITEN (io), M10 TDO (out), N7 PB9A/D3/IO3 (io), N8 PB15A/HOLDN/DI/BUSY/CSSPIN/CEN (io), N9 CCLK/MCLK/SCK (io), N10 CFG_0 (in), P7 PB6B/D4/MOSI2/IO4 (io), P8 PB13B/CS1N (io), P9 DONE (io), P10 CFG_1 (in), R6 PB4B/D6/IO6 (io), R7 PB6A/D5/MISO2/IO5 (io), R8 PB13A/SN/CSN (io), R9 PROGRAMN (in), R10 CFG_2 (in), R11 TDI (in), T6 PB4A/D7/IO7 (io), T7 PB11A/D1/MISO/IO1 (io), T8 PB11B/D0/MOSI/IO0 (io), T9 INITN (io), T10 TCK (in), T11 TMS (in)
part H pins: G6 VCC (power), G7 VCC (power), G9 VCC (power), G11 VCCAUX (power), L7 VCCAUX (power), L8 VCC (power), L9 VCC (power), L10 VCC (power)
part I pins: A1 GND (power), A16 GND (power), D2 GND (power), D15 GND (power), F8 GND (power), F9 GND (power), G8 GND (power), G10 GND (power), H1 GND (power), H8 GND (power), H9 GND (power), H10 GND (power), H16 GND (power), J8 GND (power), J9 GND (power), J10 GND (power), K6 GND (power), K7 GND (power), K8 GND (power), K9 GND (power), K10 GND (power), N2 GND (power), N15 GND (power), T1 GND (power), T5 GND (power), T12 GND (power), T16 GND (power)

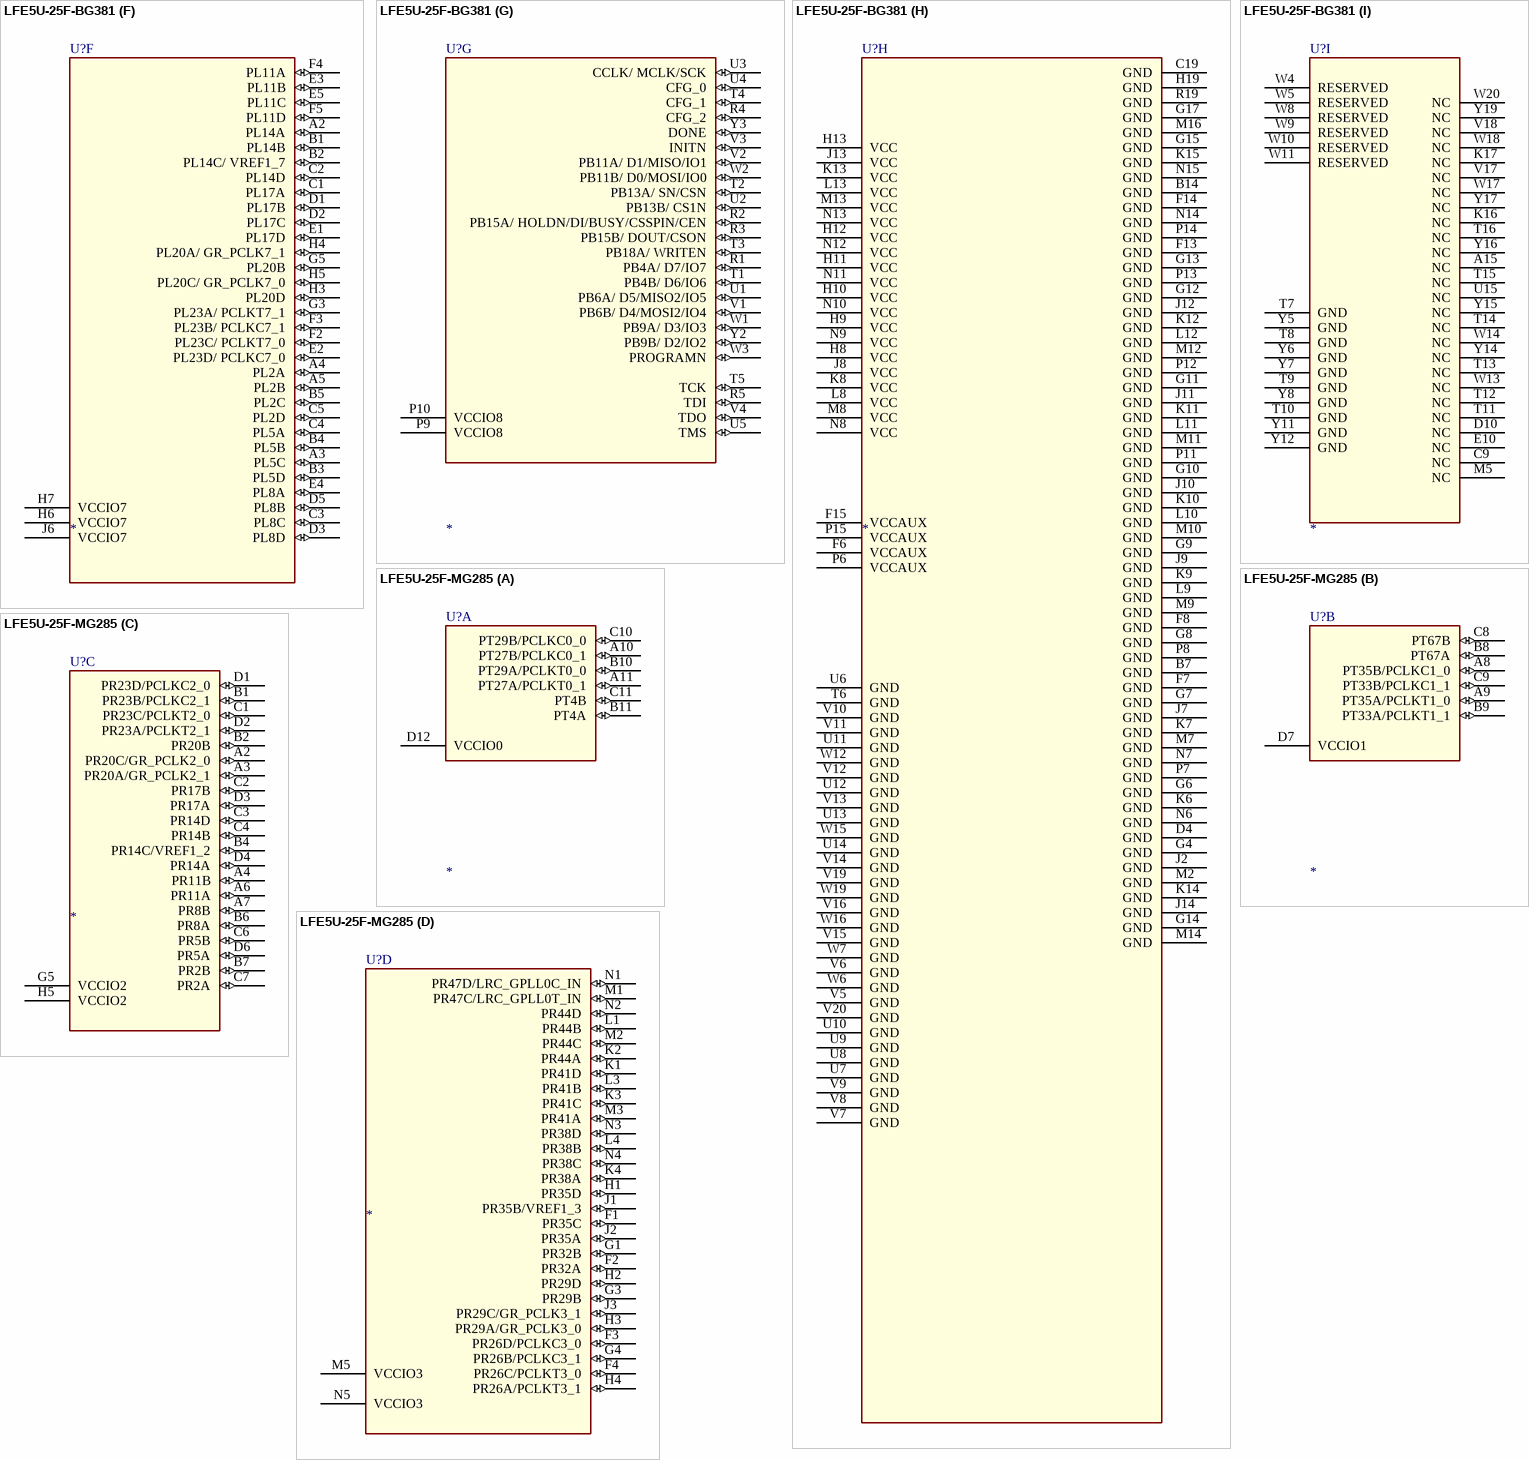
[diagram p174: symbols LFE5U-25F-BG381 to LFE5U-25F-MG285]